# Altium footprint library LimeMicroAltiumLib_pcbLib.PcbLib: 274 footprints (part 2 of 18) (continued)
## ALTR-FBGA896_A-200 [mm] "BGA, 896-Balls, Body 31x31mm, Pitch 1mm" (continued)
Top Overlay:
  circle w0.25: c-16.15,15.35 r0.125
  region: -14.5,15.5 -15.5,14.5 -15.5,15.5
  lines w0.2: -15.5,14.5 -14.5,15.5 ; -15.5,-15.5 15.5,-15.5 15.5,15.5 -15.5,15.5 -15.5,-15.5
Mechanical 13:
  lines w0.1: -15.5,-15.5 15.5,-15.5 15.5,15.5 -15.5,15.5 -15.5,-15.5
Mechanical 15:
  circle w0.35: c-15.2,15.2 r0.1
  lines w0.05: -16,-16 16,-16 16,16 -16,16 -16,-16
  lines w0.1: -0.5,0 0.5,0 ; 0,-0.5 0,0.5
  text ".Designator" at 0,0 h0.7
3D body: height 2, standoff 0.4, extent -15.5,-15.5 15.5,15.5

## AMP_MICTOR38 [mm]
pads (38):
  rect 1.27x0.43 smd: 1(-3.53,5.76) 2(3.53,5.76) 3(-3.53,5.12) 4(3.53,5.12) 5(-3.53,4.48) 6(3.53,4.48) 7(-3.53,3.84) 8(3.53,3.84) 9(-3.53,3.2) 10(3.53,3.2) 11(-3.53,2.56) 12(3.53,2.56) 13(-3.53,1.92) 14(3.53,1.92) 15(-3.53,1.28) 16(3.53,1.28) 17(-3.53,0.64) 18(3.53,0.64) 19(-3.53,0) 20(3.53,0) 21(-3.53,-0.64) 22(3.53,-0.64) 23(-3.53,-1.28) 24(3.53,-1.28) 25(-3.53,-1.92) 26(3.53,-1.92) 27(-3.53,-2.56) 28(3.53,-2.56) 29(-3.53,-3.2) 30(3.53,-3.2) 31(-3.53,-3.84) 32(3.53,-3.84) 33(-3.53,-4.48) 34(3.53,-4.48) 35(-3.53,-5.12) 36(3.53,-5.12) 37(-3.53,-5.76) 38(3.53,-5.76)
via 0,11.475 diameter 2 hole 2
via 0,5.12 diameter 1 hole 0.8
via 0,-5.12 diameter 1 hole 0.8
via 0,-2.56 diameter 1 hole 0.8
via 0,0 diameter 1 hole 0.8
via 0,2.56 diameter 1 hole 0.8
Top Overlay:
  lines w0.2: -4.5,-12 4.5,-12 4.5,13 -4.5,13 -4.5,-12
Mechanical 15:
  lines w0.3: -4.5,-12 4.5,-12 4.5,13 -4.5,13 -4.5,-12
  text ".Designator" at 0,0 h0.7
  text "1" at -3.6,6.5 h1
  text "2" at 3.1,6.5 h1
  text "37" at -3.6,-7.8 h1
  text "38" at 2,-7.7 h1

## Anaren_0805_balun [mm] "B0430J50100AHF anaren smd 0.4 GHz - 3 GHz balun"
height 0.7
pads (6):
  rect 0.45x0.35 smd mask+0.05: 1(0.65,0.49) 2(0,0.49) 3(-0.65,0.49) 4(-0.65,-0.49) 5(0,-0.49) 6(0.65,-0.49)
Top Overlay:
  lines w0.1: -1.1,-0.4 -1.1,0.4 ; 1.1,-0.4 1.1,0.4
Mechanical 15:
  lines w0.1: -1.1,-0.8 -1.1,0.8 1.1,0.8 1.1,-0.8 -1.1,-0.8
  text ".Designator" at 0,0 h0.55
Mechanical 15 keep-out:
  circle w0.1: c0.65,0.45 r0.035
3D body: height 0.7, standoff 0, extent -1.025,-0.65 1.025,0.65
3D body: height 0.71, standoff 0.7, extent 0.65,-0.1 0.85,0.1

## Anaren_0805_balun_ACXBL2012 [mm] "B0430J50100AHF anaren smd 0.4 GHz - 3 GHz balun or ACX BL2012-07M1350RK 400MHz - 2700 MHz"
height 0.7
pads (6):
  rrect50% 0.5x0.45 smd mask+0.05: 1(0.65,0.49) 2(0,0.49) 3(-0.65,0.49) 4(-0.65,-0.49) 5(0,-0.49) 6(0.65,-0.49)
Top Overlay:
  circle w0.15: c1.1,0.825 r0.056
  lines w0.1: -1.1,-0.4 -1.1,0.4 ; 1.1,-0.4 1.1,0.4
Mechanical 15:
  circle w0.1: c0.65,0.475 r0.025
  lines w0.1: -1.1,-0.8 -1.1,0.8 1.1,0.8 1.1,-0.8 -1.1,-0.8
  text ".Designator" at 0,0 h0.55
3D body: height 0.6, standoff 0, extent -0.15,-0.625 0.15,-0.475
3D body: height 0.6, standoff 0, extent 0.513,-0.625 0.813,-0.475
3D body: height 0.6, standoff 0, extent -0.812,-0.625 -0.512,-0.475
3D body: height 0.6, standoff 0, extent 0.512,0.475 0.813,0.625
3D body: height 0.6, standoff 0, extent -0.812,0.475 -0.512,0.625
3D body: height 0.6, standoff 0, extent 0.463,-0.075 0.663,0.15
3D body: height 0.6, standoff 0, extent -0.15,0.475 0.15,0.625
3D body: height 0.6, standoff 0, extent -0.862,-0.6 0.863,0.6
3D body: height 0.7, standoff 0, extent -1.025,-0.65 1.025,0.65
3D body: height 0.71, standoff 0.7, extent 0.65,-0.1 0.85,0.1

## ANTENNA_7x2x0p8 [mm] "0915AT43A0026 915 MHz ISM antenna; johansontechnology"
pads (5):
  rect 2x1.25 smd mask+0.05: 1(-2.875,-3.562) 2(-2.875,3.188)
  rect 5x0.5 smd mask+0.05: 2(0.625,3.563)
  rect 2.5x0.5 smd mask+0.05: 2(1.375,-3.437)
  rect 0.5x7 smd mask+0.05: 2(2.875,-0.187)
Top Overlay:
  circle w0.3: c-1.2,-3.537 r0.1
  lines w0.15: -4.025,-4.337 -4.025,-2.912 ; -1.725,-4.337 -1.725,-2.912
Mechanical 15:
  circle w0.3: c-2.875,-3.587 r0.1
  lines w0.15: -3.875,0.013 -2.875,0.013 ; -2.875,-0.987 -2.875,0.013 ; -2.875,1.013 -2.875,0.013 ; -1.875,0.013 -2.875,0.013 ; -4,-4.337 -1.725,-4.337 -1.725,4.013 -4,4.013 -4,-4.337
  text ".Designator" at -2.875,0.013 h0.55
3D body: height 0.85, standoff 0, extent -3.887,2.881 -1.85,3.394
3D body: height 0.85, standoff 0.01, extent -3.025,-2.65 -2.725,-1.625
3D body: height 0.85, standoff 0, extent -3.887,-3.669 -1.85,-3.156
3D body: height 0.8, standoff 0, extent -3.875,-3.637 -1.875,3.363

## ANTENNA_7x2x0p8_v2 [mm] "0915AT43A0026 915 MHz ISM antenna; johansontechnology"
pads (5):
  rect 2x1.25 smd mask+0.05: 1(-2.875,-3.562) 2(-2.875,3.188)
  rect 0.5x7 smd mask+0.05: 2(-8.625,-0.187)
  rect 2.5x0.5 smd mask+0.05: 2(-7.125,-3.437)
  rect 5x0.5 smd mask+0.05: 2(-6.375,3.563)
Top Overlay:
  circle w0.3: c-1.2,-3.537 r0.1
  lines w0.15: -4.025,-4.337 -4.025,-2.912 ; -1.725,-4.337 -1.725,-2.912
Mechanical 15:
  circle w0.3: c-2.875,-3.587 r0.1
  lines w0.15: -3.875,0.013 -2.875,0.013 ; -2.875,-0.987 -2.875,0.013 ; -2.875,1.013 -2.875,0.013 ; -1.875,0.013 -2.875,0.013 ; -4,-4.337 -1.725,-4.337 -1.725,4.013 -4,4.013 -4,-4.337
  text ".Designator" at -2.875,0.013 h0.55
3D body: height 0.85, standoff 0, extent -3.887,2.881 -1.85,3.394
3D body: height 0.85, standoff 0.01, extent -3.025,-2.65 -2.725,-1.625
3D body: height 0.85, standoff 0, extent -3.887,-3.669 -1.85,-3.156
3D body: height 0.8, standoff 0, extent -3.875,-3.637 -1.875,3.363

## ANTENNA_9x2x1p2 [mm] "2450AT45A100 2450 MHz ISM antenna; johansontechnology"
height 1.2
pads (2):
  rect 1.8x1.5 smd mask+0.05: 1(0,-4.5) 2(0,4.5)
Top Overlay:
  circle w0.3: c1.675,-4.475 r0.1
  lines w0.15: -1.15,-5.275 -1.15,-3.85 ; -1.15,3.85 -1.15,5.275 -1.15,5.475 1.15,5.475 1.15,5.275 1.15,3.85 ; 1.15,-5.275 1.15,-3.85
Mechanical 15:
  circle w0.3: c0,-4.525 r0.1
  lines w0.15: -1,0 0,0 ; 0,-1 0,0 ; 0,1 0,0 ; 1,0 0,0 ; -1.125,-5.275 1.15,-5.275 1.15,5.475 -1.125,5.475 -1.125,-5.275
  text ".Designator" at 0,0 h0.55
3D body: height 1.25, standoff 0, extent -1.019,4.194 1.019,4.706
3D body: height 1.25, standoff 0.01, extent -0.15,-3.825 0.15,-2.8
3D body: height 1.25, standoff 0, extent -1.019,-4.856 1.019,-4.344
3D body: height 1.2, standoff 0, extent -1,-4.825 1,4.675

## ANTENNA_25x5x1p2 [mm] "0433AT62A0020E 433 MHz ISM antenna; johansontechnology"
pads (2):
  rect 5.5x2 smd mask+0.05: 1(0,-12.375)
  rect 5.5x2.5 smd mask+0.05: 2(0,12.375)
Top Overlay:
  circle w0.3: c3.4,-12.5 r0.1
  lines w0.15: -2.9,-13.5 -2.9,-11.4 ; -2.9,11.4 -2.9,13.8 2.9,13.8 2.9,11.4 ; 2.9,-13.5 2.9,-11.4
Mechanical 15:
  circle w0.3: c0,-12.4 r0.1
  lines w0.15: -1,0 0,0 ; 0,-1 0,0 ; 0,1 0,0 ; 1,0 0,0 ; -2.9,-13.5 2.9,-13.5 2.9,13.8 -2.9,13.8 -2.9,-13.5
  text ".Designator" at 0,0 h0.55
3D body: height 1.25, standoff 0.01, extent -0.375,-10.325 0.375,-7.825
3D body: height 1.25, standoff 0, extent -2.525,11.425 2.525,12.45
3D body: height 1.25, standoff 0, extent -2.525,-12.6 2.525,-11.575
3D body: height 1.2, standoff 0, extent -2.5,-12.575 2.5,12.425

## ANTENNA_868MHZ_POINT3R [mm] "PTR-DA-868-5030U 915 MHz ISM/880MHz LTE antenna; point3r"
pads (7):
  rect 3x0.8 smd mask+0.05: 1(0,0) GND(0,5)
  rect 1x1 smd paste-5 mask+0.102: 1(1,-0.9) 1GND(-1,-0.9)
  rect 0.8x0.8 smd paste-5 mask+0.102: 1GND(2.9,6.4)
  rect 1x1.8 smd paste-5 mask+0.102: GND(-1,6.3)
  rect 4.8x1 smd paste-5 mask+0.102: GND(0.9,7.7)
Top Layer:
  region: 2,0.4 2.098,0.41 2.278,0.484 2.416,0.622 2.49,0.802 2.5,0.9 2.5,2.05 3.3,2.05 3.3,0.9 3.3,0.772 3.25,0.521 3.152,0.284 3.01,0.071 2.829,-0.11 2.616,-0.252 2.379,-0.35 2.128,-0.4 2,-0.4
  region: 3.3,1.05 2.5,1.05 2.5,6.8 3.3,6.8
  region: 1.05,-0.4 1.05,0.4 2.098,0.4 2.098,-0.4
Top Overlay:
  circle w0.3: c-1,-1.756 r0.1
Mechanical 15:
  circle w0.3: c0,-0.037 r0.1
  lines w0.15: -1.025,2.475 -0.025,2.475 ; -0.025,1.475 -0.025,2.475 ; -0.025,3.475 -0.025,2.475 ; 0.975,2.475 -0.025,2.475 ; -1.7,-0.525 1.7,-0.525 1.7,5.55 -1.7,5.55 -1.7,-0.525
  text ".Designator" at -0.025,2.475 h0.55
3D body: height 0.55, standoff 0, extent -1.5,-0.031 1.55,0.481
3D body: height 0.55, standoff 0, extent -1.5,4.519 1.55,5.031
3D body: height 0.5, standoff 0, extent -1.475,0 1.525,5

## ANTENNA_868MHZ_POINT3R_v2 [mm] "PTR-DA-868-5030U 915 MHz ISM/880MHz LTE antenna; point3r"
pads (7):
  rect 1x1 smd paste-5 mask+0.102: 1(-1,-0.869) 1GND(1,-0.869)
  rect 3x0.8 smd mask+0.05: 1(0,0.031) GND(0,5.031)
  rect 0.8x0.8 smd paste-5 mask+0.102: 1GND(-2.9,6.431)
  rect 4.8x1 smd paste-5 mask+0.102: GND(-0.9,7.731)
  rect 1x1.8 smd paste-5 mask+0.102: GND(1,6.331)
Top Layer:
  region: -3.3,1.081 -2.5,1.081 -2.5,6.831 -3.3,6.831
  region: -2,0.431 -2.098,0.441 -2.278,0.515 -2.416,0.653 -2.491,0.834 -2.5,0.931 -2.5,1.975 -3.3,1.975 -3.3,0.931 -3.3,0.803 -3.25,0.552 -3.152,0.315 -3.01,0.102 -2.829,-0.079 -2.616,-0.221 -2.379,-0.319 -2.128,-0.369 -2,-0.369
  region: -1.3,-0.369 -1.3,0.431 -2.098,0.431 -2.098,-0.369
Top Overlay:
  circle w0.3: c1,-1.725 r0.1
Mechanical 15:
  circle w0.3: c0,-0.006 r0.1
  lines w0.15: -1.025,2.506 -0.025,2.506 ; -0.025,1.506 -0.025,2.506 ; -0.025,3.506 -0.025,2.506 ; 0.975,2.506 -0.025,2.506 ; -1.7,-0.494 1.7,-0.494 1.7,5.581 -1.7,5.581 -1.7,-0.494
  text ".Designator" at -0.025,2.506 h0.55
3D body: height 0.55, standoff 0, extent -1.525,0 1.525,0.512
3D body: height 0.55, standoff 0, extent -1.525,4.55 1.525,5.062
3D body: height 0.5, standoff 0, extent -1.5,0.031 1.5,5.031

## ANTENNA_1880MHZ_POINT3R [mm] "PTR-DA-1819-3216U  1880-1930 MHz LTE antenna; point3r"
pads (7):
  rect 1.6x0.6 smd mask+0.05: 1(0,0) GND(0,3.2)
  rect 0.5x0.5 smd paste-5 mask+0.102: 1(0.55,-0.55) 1GND(-0.55,-0.55)
  rect 0.4x0.4 smd paste-5 mask+0.102: 1GND(2,3)
  rect 0.5x0.6 smd paste-5 mask+0.102: GND(-0.55,3.8)
  rect 2.5x0.4 smd paste-5 mask+0.102: GND(0.95,3.9)
Top Layer:
  region: 0.925,0.3 1.275,0.3 1.377,0.31 1.567,0.388 1.712,0.533 1.79,0.723 1.8,0.825 2.2,0.825 2.2,0.734 2.164,0.555 2.095,0.387 1.993,0.235 1.865,0.107 1.713,0.005 1.545,-0.064 1.366,-0.1 1.275,-0.1 0.925,-0.1
  region: 1.25,-0.1 1.25,0.3 0.8,0.3 0.8,-0.1
  region: 2.2,3.2 1.8,3.2 1.8,0.825 2.2,0.825
Top Overlay:
  circle w0.3: c-0.55,-1.05 r0.025
Mechanical 15:
  circle w0.3: c0,-0.038 r0.1
  lines w0.15: -0.5,1.7 -0.025,1.7 ; -0.025,1.225 -0.025,1.7 ; -0.025,2.175 -0.025,1.7 ; 0.45,1.7 -0.025,1.7 ; -1,-0.525 -1,4.2 1,4.2 1,-0.525 -1,-0.525
  text ".Designator" at -0.05,1.75 h0.55
3D body: height 0.55, standoff 0, extent -0.825,2.719 0.825,3.231
3D body: height 0.5, standoff 0, extent -0.8,0 0.8,3.2
3D body: height 0.55, standoff 0, extent -0.825,-0.031 0.825,0.481

## ANTENNA_1880MHZ_POINT3R_V2 [mm] "PTR-DA-1819-3216U  1880-1930 MHz LTE antenna; point3r"
pads (7):
  rect 0.5x0.5 smd paste-5 mask+0.102: 1(-0.55,-0.55) 1GND(0.55,-0.55)
  rect 1.6x0.6 smd mask+0.05: 1(0,0) GND(0,3.2)
  rect 0.4x0.4 smd paste-5 mask+0.102: 1GND(-2,3)
  rect 2.5x0.4 smd paste-5 mask+0.102: GND(-0.95,3.9)
  rect 0.5x0.6 smd paste-5 mask+0.102: GND(0.55,3.8)
Top Layer:
  region: -0.8,0.3 -1.275,0.3 -1.377,0.31 -1.567,0.388 -1.712,0.533 -1.79,0.723 -1.8,0.825 -2.2,0.825 -2.2,0.734 -2.164,0.555 -2.095,0.387 -1.993,0.235 -1.865,0.107 -1.713,0.005 -1.545,-0.064 -1.366,-0.1 -1.275,-0.1 -0.8,-0.1
  region: -1.25,-0.1 -1.25,0.3 -0.8,0.3 -0.8,-0.1
  region: -2.2,3.2 -1.8,3.2 -1.8,0.825 -2.2,0.825
Top Overlay:
  circle w0.3: c0.55,-1.05 r0.025
Mechanical 15:
  circle w0.3: c0,-0.038 r0.1
  lines w0.15: -0.5,1.7 -0.025,1.7 ; -0.025,1.225 -0.025,1.7 ; -0.025,2.175 -0.025,1.7 ; 0.45,1.7 -0.025,1.7 ; -1,-0.525 1,-0.525 1,4.2 -1,4.2 -1,-0.525
  text ".Designator" at -0.05,1.75 h0.55
3D body: height 0.55, standoff 0, extent -0.825,-0.031 0.825,0.481
3D body: height 0.5, standoff 0, extent -0.8,0 0.8,3.2
3D body: height 0.55, standoff 0, extent -0.825,2.719 0.825,3.231

## AP7361 [mm] "Low noise LDO"
height 0.63
pads (9):
  rect 0.7x0.3 smd mask+0.05: 1(-1.375,0.975) 2(-1.375,0.325) 3(-1.375,-0.325) 4(-1.375,-0.975) 5(1.375,-0.975) 6(1.375,-0.325) 7(1.375,0.325) 8(1.375,0.975)
  rect 1.6x2.35 smd mask+0.05: 9(0,0)
Top Overlay:
  circle w0.2: c-1.675,2 r0.035
  lines w0.15: -2,-0.8 -2,-1.7 -1.4,-1.7 ; -2,0.8 -2,1.7 -1.4,1.7 ; 1.4,-1.7 2,-1.7 2,-0.8 ; 1.4,1.7 2,1.7 2,0.8
Mechanical 15:
  circle w0.2: c-1.4,0.8 r0.1
  lines w0.15: -0.4,0 0,0 ; 0,-0.4 0,0 ; 0,0.4 0,0 ; 0.4,0 0,0 ; -1.9,-1.5 1.9,-1.5 1.9,1.5 -1.9,1.5 -1.9,-1.5
  text ".Designator" at 0,0 h0.55
3D body "User Library-DFN8_3x3mm__65mm.step": height 0.8, standoff 0, extent -1.52,-1.5 1.5,1.5